# Altium schematic symbol library IC_TI.SCHLIB: 1162 symbols (part 7 of 8) (continued)
## TPL7407LADR (continued)

## TPL7407LPWR
designator U?
Integrated Circuit; Manufacturer_Name: Texas Instruments; Manufacturer_Part_Number: TPL7407LPWR; Datasheet Link: http://www.farnell.com/datasheets/2024318.pdf; Height: 1.2mm; Mouser Part Number: 595-TPL7407LPWR; Mouser Price/Stock: https://www.mouser.com/Search/Refine.aspx?Keyword=595-TPL7407LPWR
footprint TSSOP16_0.65 (Shrink Small Outline; 16 Leads; Body Width 4.4 mm; Pitch 0.65 mm)
pins: 1 IN1, 2 IN2, 3 IN3, 4 IN4, 5 IN5, 6 IN6, 7 IN7, 8 GND, 9 COM, 10 OUT7, 11 OUT6, 12 OUT5, 13 OUT4, 14 OUT3, 15 OUT2, 16 OUT1

## TPS7A47XX
designator U?
footprint QFN20_0.65-PAD(5X5)
pins: 1 OUT, 3 SENSE, 4 6P4V2, 5 6P4V1, 6 3P2V, 7 GND, 8 1P6V, 9 0P8V, 10 0P4V, 11 0P2V, 12 0P1V, 13 EN, 14 NR, 15 IN, 16 IN, 20 OUT, 21 hidden to GND

## TPS7A3001DGNR
designator U?
Integrated Circuit; Manufacturer_Name: Texas Instruments; Manufacturer_Part_Number: TPS7A3001DGNR; Datasheet Link: http://www.ti.com/lit/ds/symlink/tps7a30.pdf; Height: 1.1mm; Mouser Part Number: 595-TPS7A3001DGNR; Mouser Price/Stock: https://www.mouser.com/Search/Refine.aspx?Keyword=595-TPS7A3001DGNR
footprint VSSOP8_0.65-PAD
pins: 1 OUT (out), 2 FB, 3 NC, 4 GND (power), 5 EN, 6 NR/SS, 7 DNC, 8 IN (in), 9 EP (power)

## TPS7A3001DRBT
designator U?
Integrated Circuit; Manufacturer_Name: Texas Instruments; Manufacturer_Part_Number: TPS7A3001DRBT; Datasheet Link: http://www.ti.com/lit/ds/symlink/tps7a30.pdf; Height: 1mm; Mouser Part Number: 595-TPS7A3001DRBT; Mouser Price/Stock: https://www.mouser.com/Search/Refine.aspx?Keyword=595-TPS7A3001DRBT; RS Part Number: 1685100; RS Price/Stock: http://uk.rs-online.com/web/p/products/1685100
footprint HVSON8_0.65-PAD
pins: 1 OUT (out), 2 FB, 3 NC, 4 GND (power), 5 EN, 6 NR/SS, 7 DNC, 8 IN (in), 9 EP (power)

## TPS7A3001MDGNTEP
designator U?
Integrated Circuit; Manufacturer_Name: Texas Instruments; Manufacturer_Part_Number: TPS7A3001MDGNTEP; Datasheet Link: http://www.ti.com/lit/gpn/tps7a3001-ep; Height: 1.1mm; Mouser Part Number: 595-TPS7A3001MDGNTEP; Mouser Price/Stock: https://www.mouser.com/Search/Refine.aspx?Keyword=595-TPS7A3001MDGNTEP
footprint VSSOP8_0.65-PAD
pins: 1 OUT, 2 FB, 3 NC, 4 GND, 5 EN, 6 NR/SS, 7 DNC, 8 IN, 9 EP

## TPS7A3301
designator U?
footprint QFN20_0.65-PAD(5X5)
pins: 1 OUT, 3 FB, 7 GND, 13 EN, 14 NR/SS, 15 IN, 16 IN, 20 OUT, 21 hidden to GND

## TPS7A4901DGNR
designator U?
Integrated Circuit; Manufacturer_Name: Texas Instruments; Manufacturer_Part_Number: TPS7A4901DGNR; Datasheet Link: http://www.ti.com/lit/ds/sbvs121b/sbvs121b.pdf; Height: 1.1mm; Mouser Part Number: 595-TPS7A4901DGNR; Mouser Price/Stock: https://www.mouser.com/Search/Refine.aspx?Keyword=595-TPS7A4901DGNR
footprint VSSOP8_0.65-PAD
pins: 1 OUT (out), 2 FB, 3 NC, 4 GND (power), 5 EN, 6 NR/SS, 7 DNC, 8 IN (in), 9 EP (power)

## TPS7A7001DDAR
designator U?
Integrated Circuit; Manufacturer_Name: Texas Instruments; Manufacturer_Part_Number: TPS7A7001DDAR; Datasheet Link: http://www.ti.com/lit/ds/symlink/tps7a7001.pdf; Height: 1.7mm; Mouser Part Number: 595-TPS7A7001DDAR; Mouser Price/Stock: https://www.mouser.com/Search/Refine.aspx?Keyword=595-TPS7A7001DDAR
footprint SOIC8_1.27-PAD
pins: 1 NC_1, 2 EN, 3 IN (in), 4 NC_2, 5 NC_3, 6 OUT (out), 7 FB, 8 GND (power), 9 EP

## TPS767D318PWP
designator U?
Integrated Circuit; Manufacturer_Name: Texas Instruments; Manufacturer_Part_Number: TPS767D318PWP; Datasheet Link: http://www.ti.com/lit/ds/symlink/tps767d318.pdf; Height: 1.2mm; Mouser Part Number: 595-TPS767D318PWP; Mouser Price/Stock: https://www.mouser.com/Search/Refine.aspx?Keyword=595-TPS767D318PWP; RS Part Number: 6201704P; RS Price/Stock: http://uk.rs-online.com/web/p/products/6201704P
footprint TSSOP28_0.65-PAD
pins: 1 NC, 2 NC_1, 3 1GND (power), 4 ~{1EN}, 5 1IN (in), 6 1IN_1 (in), 7 NC_2, 8 NC_3, 9 2GND (power), 10 ~{2EN}, 11 2IN (in), 12 2IN_1 (in), 13 NC_4, 14 NC_5, 15 NC_6, 16 NC_7, 17 2OUT (out), 18 2OUT_1 (out), 19 NC_8, 20 NC_9, 21 NC_10, 22 ~{2RESET}, 23 1OUT (out), 24 1OUT_1 (out), 25 1FB/NC, 26 NC_11, 27 NC_12, 28 ~{1RESET}, 29 EP

## TPS2051BD
designator U?
Integrated Circuit; Manufacturer_Name: Texas Instruments; Manufacturer_Part_Number: TPS2051BD; Datasheet Link: http://docs-emea.rs-online.com/webdocs/0c9a/0900766b80c9aee2.pdf; Height: 1.75mm; Mouser Part Number: 595-TPS2051BD; Mouser Price/Stock: https://www.mouser.com/Search/Refine.aspx?Keyword=595-TPS2051BD; RS Part Number: 1456966; RS Price/Stock: http://uk.rs-online.com/web/p/products/1456966
footprint SOIC8_1.27 (SOP, 8-Leads, Pitch 1.27mm)
pins: 1 GND (power), 2 IN_1 (in), 3 IN_2 (in), 4 ~{EN}, 5 ~{OC}, 6 OUT_1 (out), 7 OUT_2 (out), 8 OUT_3 (out)

## TPS2051BDBVR
designator U?
Integrated Circuit; Manufacturer_Name: Texas Instruments; Manufacturer_Part_Number: TPS2051BDBVR; Datasheet Link: http://www.ti.com/lit/ds/symlink/tps2051b.pdf; Height: 1.45mm; Mouser Part Number: 595-TPS2051BDBVR; Mouser Price/Stock: https://www.mouser.com/Search/Refine.aspx?Keyword=595-TPS2051BDBVR
footprint SOT23-5 (SOT23, 5-Leads, Body 3.0x3.0mm (max), Pitch 0.95mm, IPC Medium Density)
pins: 1 OUT (out), 2 GND (power), 3 ~{OC}, 4 ~{EN}, 5 IN (in)

## TPS2051BDGNR
designator U?
Integrated Circuit; Manufacturer_Name: Texas Instruments; Manufacturer_Part_Number: TPS2051BDGNR; Datasheet Link: http://www.ti.com/lit/ds/symlink/tps2051b.pdf; Height: 1.1mm; Mouser Part Number: 595-TPS2051BDGNR; Mouser Price/Stock: https://www.mouser.com/Search/Refine.aspx?Keyword=595-TPS2051BDGNR
footprint VSSOP8_0.65-PAD
pins: 1 GND (power), 2 IN_1 (in), 3 IN_2 (in), 4 ~{EN}, 5 ~{OC}, 6 OUT_1 (out), 7 OUT_2 (out), 8 OUT_3 (out), 9 EP

## TPS2513ADBVR
designator U?
Integrated Circuit; Manufacturer_Name: Texas Instruments; Manufacturer_Part_Number: TPS2513ADBVR; Datasheet Link: http://www.ti.com/lit/gpn/tps2513a; Height: 1.45mm; Mouser Part Number: 595-TPS2513ADBVR; Mouser Price/Stock: https://www.mouser.com/Search/Refine.aspx?Keyword=595-TPS2513ADBVR
footprint SOT23-6
pins: 1 DP1 (io), 2 GND (power), 3 DP2 (io), 4 DM2 (io), 5 IN (power), 6 DM1 (io)

## TPS2553DBVT
designator U?
Integrated Circuit; Manufacturer_Name: Texas Instruments; Manufacturer_Part_Number: TPS2553DBVT; Datasheet Link: http://www.ti.com/lit/ds/symlink/tps2553.pdf; Height: 1.45mm; Mouser Part Number: 595-TPS2553DBVT; Mouser Price/Stock: https://www.mouser.com/Search/Refine.aspx?Keyword=595-TPS2553DBVT; RS Part Number: 1457797; RS Price/Stock: http://uk.rs-online.com/web/p/products/1457797
footprint SOT23-6
pins: 1 IN (in), 2 GND (power), 3 EN, 4 ~{FAULT}, 5 ILIM, 6 OUT (out)

## TPS3510P
designator U?
Integrated Circuit; Manufacturer_Name: Texas Instruments; Manufacturer_Part_Number: TPS3510P; Datasheet Link: http://www.ti.com/lit/ds/symlink/tps3510.pdf; Height: 5.08mm; Mouser Part Number: 595-TPS3510P; Mouser Price/Stock: https://www.mouser.com/Search/Refine.aspx?Keyword=595-TPS3510P; RS Part Number: 6624942P; RS Price/Stock: http://uk.rs-online.com/web/p/products/6624942P
footprint DIP8-A
pins: 1 PGI (in), 2 GND (power), 3 ~{FPO} (out), 4 ~{PSON} (in), 5 VS33 (in), 6 VS5 (in), 7 VDD (power), 8 PGO (out)

## TPS3808G09DBVR
designator U?
Integrated Circuit; Manufacturer_Name: Texas Instruments; Manufacturer_Part_Number: TPS3808G09DBVR; Datasheet Link: http://www.ti.com/lit/gpn/tps3808; Mouser Part Number: 595-TPS3808G09DBVR; Mouser Price/Stock: https://www.mouser.com/Search/Refine.aspx?Keyword=595-TPS3808G09DBVR
footprint SOT23-6
pins: 1 ~RESET, 2 GND, 3 ~MR, 4 CT, 5 SENSE, 6 VDD

## TPS3808G25DBVR
designator U?
Integrated Circuit; Manufacturer_Name: Texas Instruments; Manufacturer_Part_Number: TPS3808G25DBVR; Datasheet Link: http://www.ti.com/general/docs/lit/getliterature.tsp?genericPartNumber=TPS3808G25&&fileType=pdf; Height: 1.45mm; Mouser Part Number: 595-TPS3808G25DBVR; Mouser Price/Stock: https://www.mouser.com/Search/Refine.aspx?Keyword=595-TPS3808G25DBVR
footprint SOT23-6
pins: 1 ~{RESET}, 2 GND, 3 ~{MR}, 4 CR, 5 SENSE, 6 VDD

## TPS3808G33DBVR
designator U?
Integrated Circuit; Manufacturer_Name: Texas Instruments; Manufacturer_Part_Number: TPS3808G33DBVR; Datasheet Link: http://www.ti.com/lit/gpn/tps3808; Height: 1.45mm; Mouser Part Number: 595-TPS3808G33DBVR; Mouser Price/Stock: https://www.mouser.com/Search/Refine.aspx?Keyword=595-TPS3808G33DBVR
footprint SOT23-6
pins: 1 ~{RESET}, 2 GND, 3 ~{MR}, 4 CT, 5 SENSE, 6 VDD

## TPS3809K33DBVT
designator U?
Integrated Circuit; Manufacturer_Name: Texas Instruments; Manufacturer_Part_Number: TPS3809K33DBVT; Datasheet Link: http://www.ti.com/lit/ds/symlink/tps3809k33.pdf; Height: 1.45mm; Mouser Part Number: 595-TPS3809K33DBVT; Mouser Price/Stock: https://www.mouser.com/Search/Refine.aspx?Keyword=595-TPS3809K33DBVT; RS Part Number: 6624227P; RS Price/Stock: http://uk.rs-online.com/web/p/products/6624227P
footprint SOT23-3 (贴片MOS的SOT-23封装)
pins: 1 GND (power), 2 ~{RESET}, 3 VDD (power)

## TPS3823
designator U?
Integrated Circuit; Manufacturer_Name: Texas Instruments; Manufacturer_Part_Number: TPS3823-25QDBVRQ1; Datasheet Link: http://docs-emea.rs-online.com/webdocs/0f67/0900766b80f67970.pdf; Height: 1.45mm; Mouser Part Number: 595-TPS3823-25QDBVRQ; Mouser Price/Stock: https://www.mouser.com/Search/Refine.aspx?Keyword=595-TPS3823-25QDBVRQ; RS Part Number: 1457799; RS Price/Stock: http://uk.rs-online.com/web/p/products/1457799
footprint SOT23-5 (SOT23, 5-Leads, Body 3.0x3.0mm (max), Pitch 0.95mm, IPC Medium Density)
pins: 1 ~{RESET}, 2 GND (power), 3 ~{MR}, 4 WDI, 5 VDD (power)

## TPS3824-33DBVT
designator U?
Integrated Circuit; Manufacturer_Name: Texas Instruments; Manufacturer_Part_Number: TPS3824-33DBVT; Datasheet Link: http://www.ti.com/lit/ds/symlink/tps3824-33.pdf; Height: 1.45mm; Mouser Part Number: 595-TPS3824-33DBVT; Mouser Price/Stock: https://www.mouser.com/Search/ProductDetail.aspx?qs=zwk82MlA57YGPW8aoiJwEQ%3d%3d; RS Part Number: 6200717; RS Price/Stock: http://uk.rs-online.com/web/p/voltage-supervisors/6200717/?source=DS
footprint SOT23-5 (SOT23, 5-Leads, Body 3.0x3.0mm (max), Pitch 0.95mm, IPC Medium Density)
pins: 1 ~{RESET}, 2 GND (power), 3 RESET, 4 WDI, 5 VDD (power)

## TPS3828-33DBVT
designator U?
Integrated Circuit; Manufacturer_Name: Texas Instruments; Manufacturer_Part_Number: TPS3828-33DBVT; Datasheet Link: http://www.ti.com/lit/ds/symlink/tps3828-33.pdf; Height: 1.45mm; Mouser Part Number: 595-TPS3828-33DBVT; Mouser Price/Stock: https://www.mouser.com/Search/Refine.aspx?Keyword=595-TPS3828-33DBVT; RS Part Number: 1218677; RS Price/Stock: http://uk.rs-online.com/web/p/products/1218677
footprint SOT23-5 (SOT23, 5-Leads, Body 3.0x3.0mm (max), Pitch 0.95mm, IPC Medium Density)
pins: 1 ~{RESET}, 2 GND (power), 3 ~{MR}, 4 WDI, 5 VDD (power)

## TPS5401DGQR
designator U?
Integrated Circuit; Manufacturer_Name: Texas Instruments; Manufacturer_Part_Number: TPS5401DGQR; Datasheet Link: http://www.mouser.com/ds/2/405/tps5401-449342.pdf; Height: 1.1mm; Mouser Part Number: 595-TPS5401DGQR; Mouser Price/Stock: https://www.mouser.com/Search/Refine.aspx?Keyword=595-TPS5401DGQR
footprint VSSOP10_0.5-PAD
pins: 1 BOOT, 2 VIN, 3 EN, 4 SS/TR, 5 RT/CLK, 6 PWRGD, 7 VSENSE, 8 COMP, 9 GND, 10 PH, 11 TP

## TPS5420QDRQ1
designator U?
Integrated Circuit; Manufacturer_Name: Texas Instruments; Manufacturer_Part_Number: TPS5420QDRQ1; Datasheet Link: http://www.ti.com/lit/ds/symlink/tps5420-q1.pdf; Height: 1.75mm; Mouser Part Number: 595-TPS5420QDRQ1; Mouser Price/Stock: https://www.mouser.com/Search/Refine.aspx?Keyword=595-TPS5420QDRQ1
footprint SOIC8_1.27 (SOP, 8-Leads, Pitch 1.27mm)
pins: 1 BOOT, 2 NC_1, 3 NC_2, 4 VSENSE, 5 ENA, 6 GND, 7 VIN, 8 PH

## TPS5430
designator U?
footprint SOIC8_1.27-PAD
pins: 1 BOOT, 4 VSENSE, 5 ENA, 6 GND, 7 VIN, 8 PH, 9 PAD

## TPS5430DDA
designator U?
Integrated Circuit; Manufacturer_Name: Texas Instruments; Manufacturer_Part_Number: TPS5430DDA; Datasheet Link: http://docs-emea.rs-online.com/webdocs/0a1b/0900766b80a1b5c6.pdf; Height: 1.7mm; Mouser Part Number: 595-TPS5430DDA; Mouser Price/Stock: https://www.mouser.com/Search/Refine.aspx?Keyword=595-TPS5430DDA; RS Part Number: 0182212P; RS Price/Stock: http://uk.rs-online.com/web/p/products/0182212P
footprint SOIC8_1.27-PAD
pins: 1 BOOT, 2 NC, 3 NC_1, 4 VSENSE, 5 ENA, 6 GND (power), 7 VIN (in), 8 PH, 9 EP

## TPS5450DDA
designator U?
Integrated Circuit; Manufacturer_Name: Texas Instruments; Manufacturer_Part_Number: TPS5450DDA; Datasheet Link: http://www.ti.com/lit/ds/symlink/tps5450.pdf; Height: 1.75mm; Mouser Part Number: 595-TPS5450DDA; Mouser Price/Stock: https://www.mouser.com/Search/Refine.aspx?Keyword=595-TPS5450DDA; RS Part Number: 0422952P; RS Price/Stock: http://uk.rs-online.com/web/p/products/0422952P
footprint SOIC8_1.27 (SOP, 8-Leads, Pitch 1.27mm)
pins: 1 BOOT, 2 NC, 3 NC_1, 4 VSENSE, 5 ENA, 6 GND (power), 7 VIN (in), 8 PH

## TPS7333QD
designator U?
Integrated Circuit; Manufacturer_Name: Texas Instruments; Manufacturer_Part_Number: TPS7333QD; Datasheet Link: http://componentsearchengine.com/Datasheets/3/TPS7333QD.pdf; Mouser Part Number: 595-TPS7333QD; Mouser Price/Stock: https://www.mouser.com/Search/Refine.aspx?Keyword=595-TPS7333QD; RS Part Number: 1625973; RS Price/Stock: http://uk.rs-online.com/web/p/products/1625973
footprint SOIC8_1.27 (SOP, 8-Leads, Pitch 1.27mm)
pins: 1 GND, 2 ~EN, 3 IN_2, 4 IN, 5 OUT_2, 6 OUT, 7 SENSE/FB, 8 ~RESET

## TPS22918DBVT
designator S??
Switch; Manufacturer_Name: Texas Instruments; Manufacturer_Part_Number: TPS22918DBVT; Datasheet Link: http://www.ti.com/lit/gpn/tps22918; Height: 1.45mm; Mouser Part Number: 595-TPS22918DBVT; Mouser Price/Stock: https://www.mouser.com/Search/Refine.aspx?Keyword=595-TPS22918DBVT
footprint SOT23-6
pins: 1 VIN (power), 2 GND (power), 3 ON (in), 4 CT (out), 5 QOD (out), 6 VOUT (out)

## TPS22965NDSGR
designator U?
Integrated Circuit; Manufacturer_Name: Texas Instruments; Manufacturer_Part_Number: TPS22965NDSGR; Datasheet Link: http://www.ti.com/lit/ds/symlink/tps22965.pdf; Height: 0.8mm; Mouser Part Number: 595-TPS22965NDSGR; Mouser Price/Stock: https://www.mouser.com/Search/Refine.aspx?Keyword=595-TPS22965NDSGR
footprint DFN8_0.5-PAD(2X2) (DFN8_0.5-PAD(3X3))
pins: 1 VIN_1, 2 VIN_2, 3 ON, 4 VBIAS, 5 GND, 6 CT, 7 VOUT_1, 8 VOUT_2, 9 EP

## TPS23753APWR
designator U?
Integrated Circuit; Manufacturer_Name: Texas Instruments; Datasheet Link: http://www.ti.com/lit/gpn/tps23753a; Manufacturer_Part_Number: TPS23753APWR; Mouser Part Number: 595-TPS23753APWR; Mouser Price/Stock: https://www.mouser.com/Search/Refine.aspx?Keyword=595-TPS23753APWR
footprint TSSOP14_0.65 (TSOP, 14-Leads, Body 5.00x4.40mm, Pitch 0.65mm, Thermal Pad 2.31x2.46mm, IPC Low Density)
pins: 1 CTL, 2 VB, 3 CS, 4 VC, 5 GATE, 6 RTN, 7 VSS, 8 VDD1, 9 VDD, 10 DEN, 11 CLS, 12 APD, 13 BLNK, 14 FRS

## TPS27081ADDCR
designator U?
Integrated Circuit; Manufacturer_Name: Texas Instruments; Manufacturer_Part_Number: TPS27081ADDCR; Datasheet Link: http://www.ti.com/lit/ds/symlink/tps27081a.pdf; Height: 1.1mm; Mouser Part Number: 595-TPS27081ADDCR; Mouser Price/Stock: https://www.mouser.com/Search/Refine.aspx?Keyword=595-TPS27081ADDCR; RS Part Number: 8095429P; RS Price/Stock: http://uk.rs-online.com/web/p/products/8095429P
footprint SOT23-6
pins: 1 R2, 2 VOUT_1 (out), 3 VOUT_2 (out), 4 VIN (in), 5 ON/OFF, 6 R1/C1

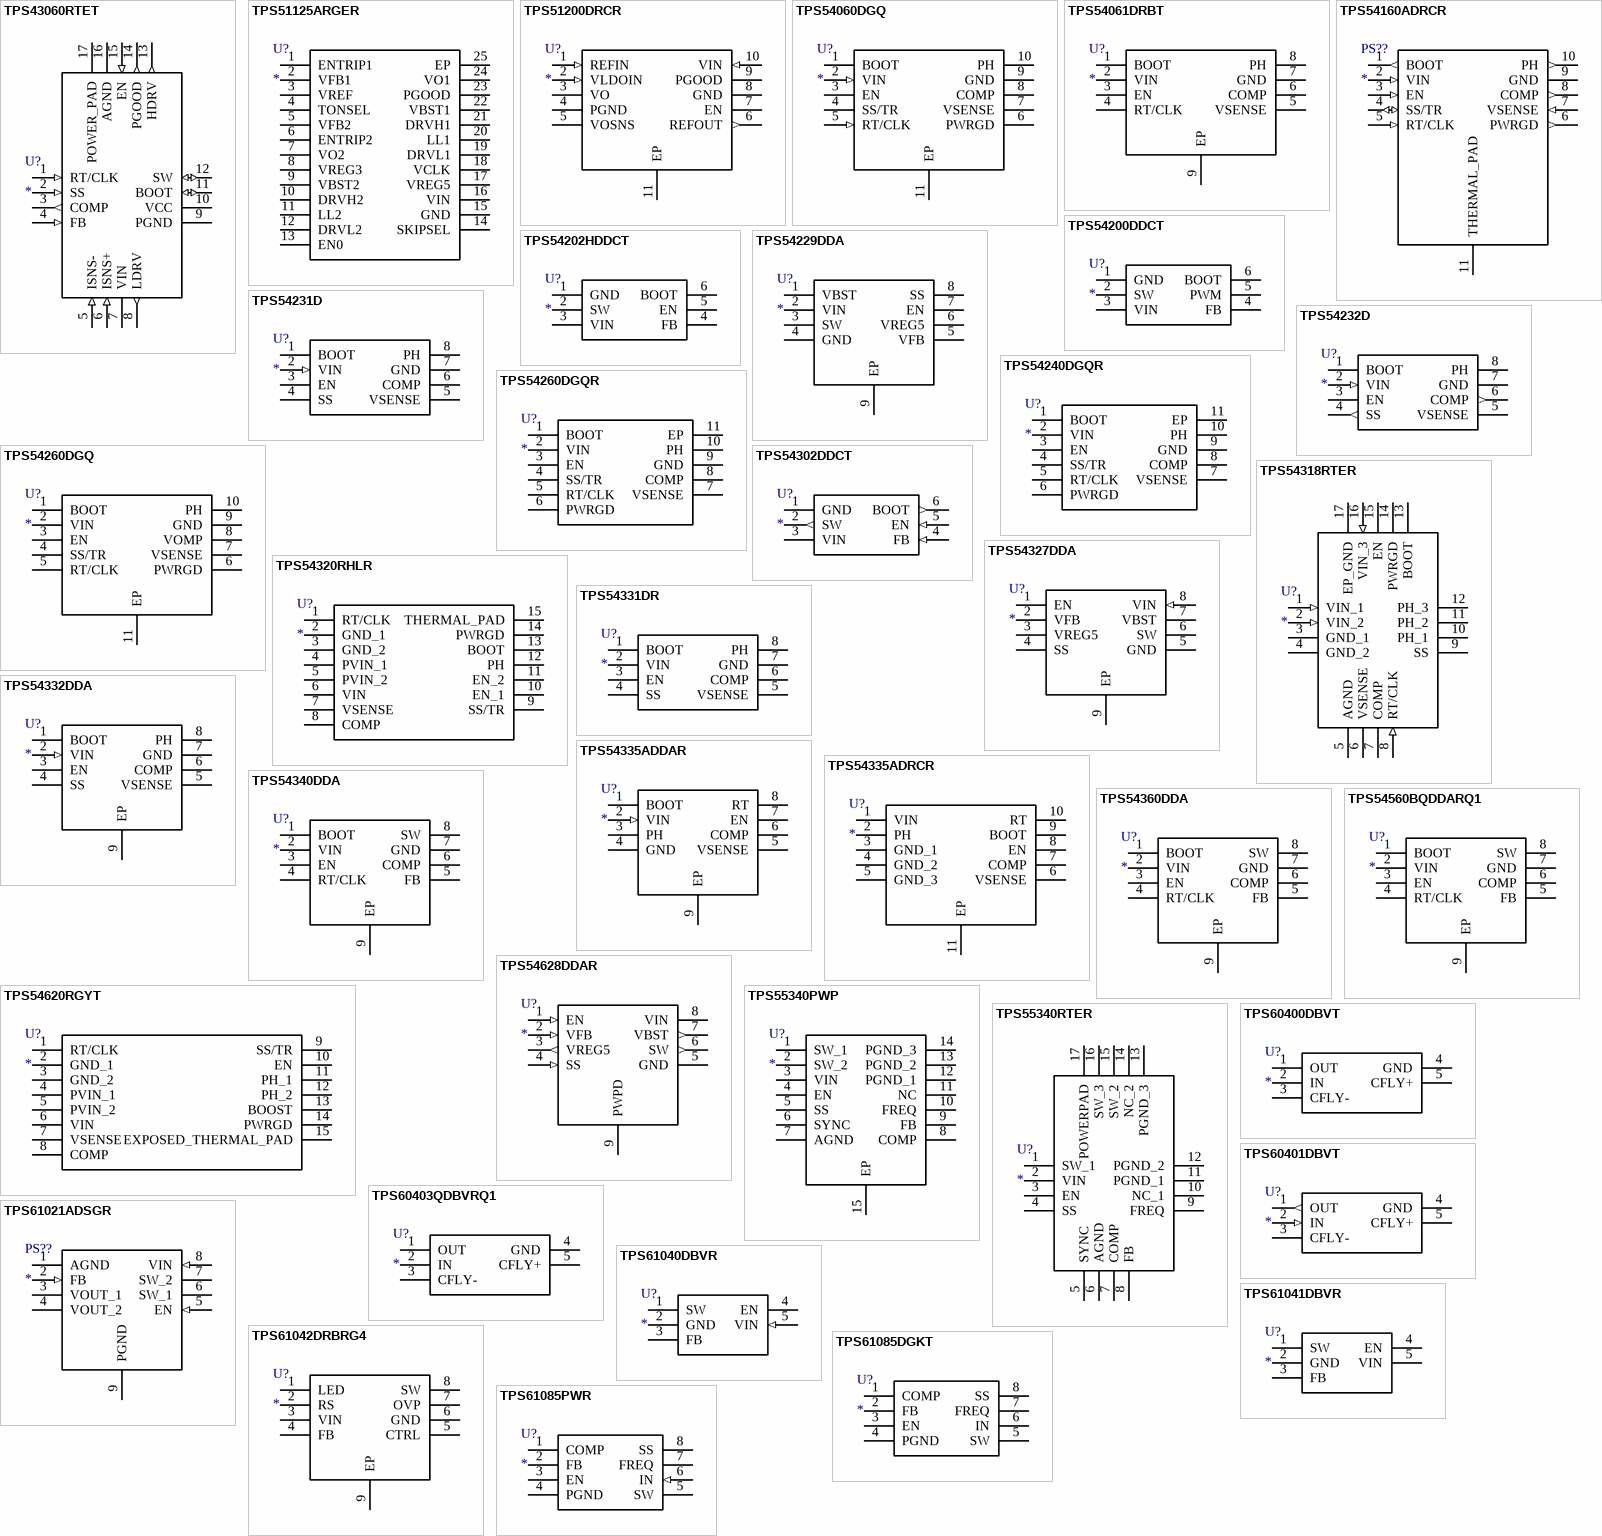
[diagram p31: symbols TPS43060RTET to TPS61085PWR]

## TPS43060RTET
designator U?
Integrated Circuit; Manufacturer_Name: Texas Instruments; Manufacturer_Part_Number: TPS43060RTET; Datasheet Link: http://www.ti.com/lit/ds/symlink/tps43060.pdf; Height: 0.8mm; Mouser Part Number: 595-TPS43060RTET; Mouser Price/Stock: https://www.mouser.com/Search/Refine.aspx?Keyword=595-TPS43060RTET; RS Part Number: 8120483P; RS Price/Stock: http://uk.rs-online.com/web/p/products/8120483P
footprint QFN16_0.5-PAD(3X3) (QFN, 16-Leads, Body 3.0x3.0mm (max), Pitch 0.50mm, IPC Low Density)
pins: 1 RT/CLK (in), 2 SS (in), 3 COMP (out), 4 FB (in), 5 ISNS- (in), 6 ISNS+ (in), 7 VIN (power), 8 LDRV (out), 9 PGND (power), 10 VCC (power), 11 BOOT (io), 12 SW (io), 13 HDRV (out), 14 PGOOD (out), 15 EN (in), 16 AGND (power), 17 POWER_PAD

## TPS51125ARGER
designator U?
Integrated Circuit; Manufacturer_Name: Texas Instruments; Manufacturer_Part_Number: TPS51125ARGER; Datasheet Link: http://www.ti.com/lit/gpn/tps51125a; Mouser Part Number: 595-TPS51125ARGER; Mouser Price/Stock: https://www.mouser.com/Search/Refine.aspx?Keyword=595-TPS51125ARGER
footprint QFN24_0.5-PAD(4X4) (QFN, 24-Leads, Body 4.1x4.1mm (max), Pitch 0.50mm, IPC Medium Density)
pins: 1 ENTRIP1, 2 VFB1, 3 VREF, 4 TONSEL, 5 VFB2, 6 ENTRIP2, 7 VO2, 8 VREG3, 9 VBST2, 10 DRVH2, 11 LL2, 12 DRVL2, 13 EN0, 14 SKIPSEL, 15 GND, 16 VIN, 17 VREG5, 18 VCLK, 19 DRVL1, 20 LL1, 21 DRVH1, 22 VBST1, 23 PGOOD, 24 VO1, 25 EP

## TPS51200DRCR
designator U?
Integrated Circuit; Manufacturer_Name: Texas Instruments; Manufacturer_Part_Number: TPS51200DRCR; Datasheet Link: http://www.ti.com/lit/ds/symlink/tps51200.pdf; Height: 1mm; Mouser Part Number: 595-TPS51200DRCR; Mouser Price/Stock: https://www.mouser.com/Search/Refine.aspx?Keyword=595-TPS51200DRCR; RS Part Number: 1628792; RS Price/Stock: http://uk.rs-online.com/web/p/products/1628792
footprint DFN10_0.5-PAD(3X3)
pins: 1 REFIN (in), 2 VLDOIN (in), 3 VO, 4 PGND (power), 5 VOSNS, 6 REFOUT (out), 7 EN, 8 GND (power), 9 PGOOD, 10 VIN (in), 11 EP

## TPS54060DGQ
designator U?
Integrated Circuit; Manufacturer_Name: Texas Instruments; Manufacturer_Part_Number: TPS54060DGQ; Datasheet Link: http://www.ti.com/lit/ds/symlink/tps54060.pdf; Height: 1.1mm; Mouser Part Number: 595-TPS54060DGQ; Mouser Price/Stock: https://www.mouser.com/Search/Refine.aspx?Keyword=595-TPS54060DGQ; RS Part Number: 9236677; RS Price/Stock: http://uk.rs-online.com/web/p/products/9236677
footprint VSSOP10_0.5-PAD
pins: 1 BOOT, 2 VIN (in), 3 EN, 4 SS/TR, 5 RT/CLK (in), 6 PWRGD, 7 VSENSE, 8 COMP, 9 GND (power), 10 PH, 11 EP (power)

## TPS54061DRBT
designator U?
Integrated Circuit; Manufacturer_Name: Texas Instruments; Manufacturer_Part_Number: TPS54061DRBT; Datasheet Link: http://www.ti.com/lit/gpn/tps54061; Height: 1mm; Mouser Part Number: 595-TPS54061DRBT; Mouser Price/Stock: https://www.mouser.com/Search/Refine.aspx?Keyword=595-TPS54061DRBT; RS Part Number: 7741446P; RS Price/Stock: http://uk.rs-online.com/web/p/products/7741446P
footprint HVSON8_0.65-PAD
pins: 1 BOOT, 2 VIN, 3 EN, 4 RT/CLK, 5 VSENSE, 6 COMP, 7 GND, 8 PH, 9 EP

## TPS54160ADRCR
designator PS??
Power Supply; Manufacturer_Name: Texas Instruments; Manufacturer_Part_Number: TPS54160ADRCR; Datasheet Link: http://www.ti.com/lit/gpn/tps54160a; Height: 0.6mm; Mouser Part Number: 595-TPS54160ADRCR; Mouser Price/Stock: https://www.mouser.com/Search/Refine.aspx?Keyword=595-TPS54160ADRCR
footprint DFN10_0.5-PAD(3X3)
pins: 1 BOOT (out), 2 VIN (in), 3 EN (in), 4 SS/TR (io), 5 RT/CLK (in), 6 PWRGD (out), 7 VSENSE (in), 8 COMP (out), 9 GND (power), 10 PH (out), 11 THERMAL_PAD (power)

## TPS54200DDCT
designator U?
Integrated Circuit; Manufacturer_Name: Texas Instruments; Manufacturer_Part_Number: TPS54200DDCT; Datasheet Link: http://www.ti.com/lit/gpn/tps54200; Height: 1.1mm; Mouser Part Number: 595-TPS54200DDCT; Mouser Price/Stock: https://www.mouser.com/Search/Refine.aspx?Keyword=595-TPS54200DDCT
footprint SOT23-6
pins: 1 GND, 2 SW, 3 VIN, 4 FB, 5 PWM, 6 BOOT

## TPS54202HDDCT
designator U?
Integrated Circuit; Manufacturer_Name: Texas Instruments; Manufacturer_Part_Number: TPS54202HDDCT; Datasheet Link: http://www.ti.com/general/docs/lit/getliterature.tsp?genericPartNumber=TPS54202H&&fileType=pdf; Height: 1.1mm; Mouser Part Number: 595-TPS54202HDDCT; Mouser Price/Stock: https://www.mouser.com/Search/Refine.aspx?Keyword=595-TPS54202HDDCT
footprint SOT23-6
pins: 1 GND, 2 SW, 3 VIN, 4 FB, 5 EN, 6 BOOT

## TPS54229DDA
designator U?
Integrated Circuit; Manufacturer_Name: Texas Instruments; Manufacturer_Part_Number: TPS54229DDA; Datasheet Link: http://www.ti.com/lit/ds/symlink/tps54229.pdf; Height: 1.7mm; Mouser Part Number: 595-TPS54229DDA; Mouser Price/Stock: https://www.mouser.com/Search/Refine.aspx?Keyword=595-TPS54229DDA
footprint SOIC8_1.27-PAD
pins: 1 VBST, 2 VIN, 3 SW, 4 GND, 5 VFB, 6 VREG5, 7 EN, 8 SS, 9 EP

## TPS54231D
designator U?
Integrated Circuit; Manufacturer_Name: Texas Instruments; Manufacturer_Part_Number: TPS54231D; Datasheet Link: http://www.ti.com/lit/ds/symlink/tps54231.pdf; Height: 1.75mm; Mouser Part Number: 595-TPS54231D; Mouser Price/Stock: https://www.mouser.com/Search/Refine.aspx?Keyword=595-TPS54231D; RS Part Number: 7093289P; RS Price/Stock: http://uk.rs-online.com/web/p/products/7093289P
footprint SOIC8_1.27 (SOP, 8-Leads, Pitch 1.27mm)
pins: 1 BOOT, 2 VIN (in), 3 EN, 4 SS, 5 VSENSE, 6 COMP, 7 GND (power), 8 PH

## TPS54232D
designator U?
Integrated Circuit; Manufacturer_Name: Texas Instruments; Manufacturer_Part_Number: TPS54232D; Datasheet Link: http://www.ti.com/lit/ds/symlink/tps54232.pdf; Height: 1.75mm; Mouser Part Number: 595-TPS54232D; Mouser Price/Stock: https://www.mouser.com/Search/Refine.aspx?Keyword=595-TPS54232D; RS Part Number: 6989085P; RS Price/Stock: http://uk.rs-online.com/web/p/products/6989085P
footprint SOIC8_1.27 (SOP, 8-Leads, Pitch 1.27mm)
pins: 1 BOOT, 2 VIN (in), 3 EN, 4 SS (out), 5 VSENSE, 6 COMP (out), 7 GND (power), 8 PH

## TPS54240DGQR
designator U?
Integrated Circuit; Manufacturer_Name: Texas Instruments; Manufacturer_Part_Number: TPS54240DGQR; Datasheet Link: http://www.ti.com/lit/gpn/tps54240; Mouser Part Number: 595-TPS54240DGQR; Mouser Price/Stock: https://www.mouser.com/Search/Refine.aspx?Keyword=595-TPS54240DGQR; RS Part Number: 1628793; RS Price/Stock: http://uk.rs-online.com/web/p/products/1628793
footprint VSSOP10_0.5-PAD
pins: 1 BOOT, 2 VIN, 3 EN, 4 SS/TR, 5 RT/CLK, 6 PWRGD, 7 VSENSE, 8 COMP, 9 GND, 10 PH, 11 EP

## TPS54260DGQ
designator U?
Integrated Circuit; Manufacturer_Name: Texas Instruments; Manufacturer_Part_Number: TPS54260DGQ; Datasheet Link: http://www.ti.com/lit/ds/symlink/tps54260.pdf; Height: 1.1mm; Mouser Part Number: 595-TPS54260DGQ; Mouser Price/Stock: https://www.mouser.com/Search/Refine.aspx?Keyword=595-TPS54260DGQ; RS Part Number: 9222404; RS Price/Stock: http://uk.rs-online.com/web/p/products/9222404
footprint VSSOP10_0.5-PAD
pins: 1 BOOT, 2 VIN, 3 EN, 4 SS/TR, 5 RT/CLK, 6 PWRGD, 7 VSENSE, 8 VOMP, 9 GND, 10 PH, 11 EP

## TPS54260DGQR
designator U?
Integrated Circuit; Manufacturer_Name: Texas Instruments; Manufacturer_Part_Number: TPS54260DGQR; Mouser Part Number: 595-TPS54260DGQR; Mouser Price/Stock: https://www.mouser.com/Search/Refine.aspx?Keyword=595-TPS54260DGQR; RS Part Number: 8256826P; RS Price/Stock: http://uk.rs-online.com/web/p/products/8256826P
footprint VSSOP10_0.5-PAD
pins: 1 BOOT, 2 VIN, 3 EN, 4 SS/TR, 5 RT/CLK, 6 PWRGD, 7 VSENSE, 8 COMP, 9 GND, 10 PH, 11 EP

## TPS54302DDCT
designator U?
Integrated Circuit; Manufacturer_Name: Texas Instruments; Manufacturer_Part_Number: TPS54302DDCT; Datasheet Link: https://componentsearchengine.com/Datasheets/2/TPS54302DDCT.pdf; Height: 1.1mm; Mouser Part Number: 595-TPS54302DDCT; Mouser Price/Stock: https://www.mouser.com/Search/Refine.aspx?Keyword=595-TPS54302DDCT
footprint SOT23-6
pins: 1 GND (power), 2 SW (out), 3 VIN (power), 4 FB (in), 5 EN (in), 6 BOOT (out)

## TPS54318RTER
designator U?
Integrated Circuit; Manufacturer_Name: Texas Instruments; Manufacturer_Part_Number: TPS54318RTER; Datasheet Link: http://www.ti.com/lit/ds/symlink/tps54318.pdf; Height: 0.8mm; Mouser Part Number: 595-TPS54318RTER; Mouser Price/Stock: https://www.mouser.com/Search/Refine.aspx?Keyword=595-TPS54318RTER
footprint QFN16_0.5-PAD(3X3) (QFN, 16-Leads, Body 3.0x3.0mm (max), Pitch 0.50mm, IPC Low Density)
pins: 1 VIN_1 (in), 2 VIN_2 (in), 3 GND_1 (power), 4 GND_2 (power), 5 AGND (power), 6 VSENSE, 7 COMP, 8 RT/CLK (in), 9 SS, 10 PH_1, 11 PH_2, 12 PH_3, 13 BOOT, 14 PWRGD, 15 EN, 16 VIN_3 (in), 17 EP_GND (power)

## TPS54320RHLR
designator U?
Integrated Circuit; Manufacturer_Name: Texas Instruments; Manufacturer_Part_Number: TPS54320RHLR; Datasheet Link: http://www.ti.com/lit/gpn/tps54320; Mouser Part Number: 595-TPS54320RHLR; Mouser Price/Stock: https://www.mouser.com/Search/Refine.aspx?Keyword=595-TPS54320RHLR; RS Part Number: 9213053; RS Price/Stock: http://uk.rs-online.com/web/p/products/9213053
footprint QFN14_0.5-PAD(3.5X3.5)
pins: 1 RT/CLK, 2 GND_1, 3 GND_2, 4 PVIN_1, 5 PVIN_2, 6 VIN, 7 VSENSE, 8 COMP, 9 SS/TR, 10 EN_1, 11 EN_2, 12 PH, 13 BOOT, 14 PWRGD, 15 THERMAL_PAD

## TPS54327DDA
designator U?
Integrated Circuit; Manufacturer_Name: Texas Instruments; Manufacturer_Part_Number: TPS54327DDA; Datasheet Link: http://www.ti.com/lit/ds/symlink/tps54327.pdf; Height: 1.7mm; Mouser Part Number: 595-TPS54327DDA; Mouser Price/Stock: https://www.mouser.com/Search/Refine.aspx?Keyword=595-TPS54327DDA; RS Part Number: 7300663P; RS Price/Stock: http://uk.rs-online.com/web/p/products/7300663P
footprint SOIC8_1.27-PAD
pins: 1 EN, 2 VFB, 3 VREG5, 4 SS, 5 GND (power), 6 SW, 7 VBST, 8 VIN (in), 9 EP

## TPS54331DR
designator U?
Integrated Circuit; Manufacturer_Name: Texas Instruments; Manufacturer_Part_Number: TPS54331DR; Datasheet Link: http://www.ti.com/lit/gpn/tps54331; Height: 1.75mm; Mouser Part Number: 595-TPS54331DR; Mouser Price/Stock: https://www.mouser.com/Search/Refine.aspx?Keyword=595-TPS54331DR; RS Part Number: 8256832P; RS Price/Stock: http://uk.rs-online.com/web/p/products/8256832P
footprint SOIC8_1.27 (SOP, 8-Leads, Pitch 1.27mm)
pins: 1 BOOT, 2 VIN, 3 EN, 4 SS, 5 VSENSE, 6 COMP, 7 GND, 8 PH

## TPS54332DDA
designator U?
Integrated Circuit; Manufacturer_Name: Texas Instruments; Manufacturer_Part_Number: TPS54332DDA; Datasheet Link: http://www.ti.com/lit/ds/symlink/tps54332.pdf; Height: 1.7mm; Mouser Part Number: 595-TPS54332DDA; Mouser Price/Stock: https://www.mouser.com/Search/Refine.aspx?Keyword=595-TPS54332DDA; RS Part Number: 6989094P; RS Price/Stock: http://uk.rs-online.com/web/p/products/6989094P
footprint SOIC8_1.27-PAD
pins: 1 BOOT, 2 VIN (in), 3 EN, 4 SS, 5 VSENSE, 6 COMP, 7 GND (power), 8 PH, 9 EP (power)

## TPS54335ADDAR
designator U?
Integrated Circuit; Manufacturer_Name: Texas Instruments; Manufacturer_Part_Number: TPS54335ADDAR; Datasheet Link: http://www.ti.com/lit/ds/symlink/tps54335a.pdf; Height: 1.7mm; Mouser Part Number: 595-TPS54335ADDAR; Mouser Price/Stock: https://www.mouser.com/Search/Refine.aspx?Keyword=595-TPS54335ADDAR
footprint SOIC8_1.27-PAD
pins: 1 BOOT, 2 VIN (in), 3 PH, 4 GND (power), 5 VSENSE, 6 COMP, 7 EN, 8 RT, 9 EP (power)